# Altium footprint library PCB贴片元件封装库.pcblib: 366 footprints (part 7 of 23)
Each footprint in its own frame and in the unit in brackets; x right, y up, seen from the top. Pads: shape width x height; smd on the part's side, far side on the other; paste and mask are expansions set on the pad; w line width, h text height; cw(c..) or ccw(c..) is an arc to the next point about the centre after c.
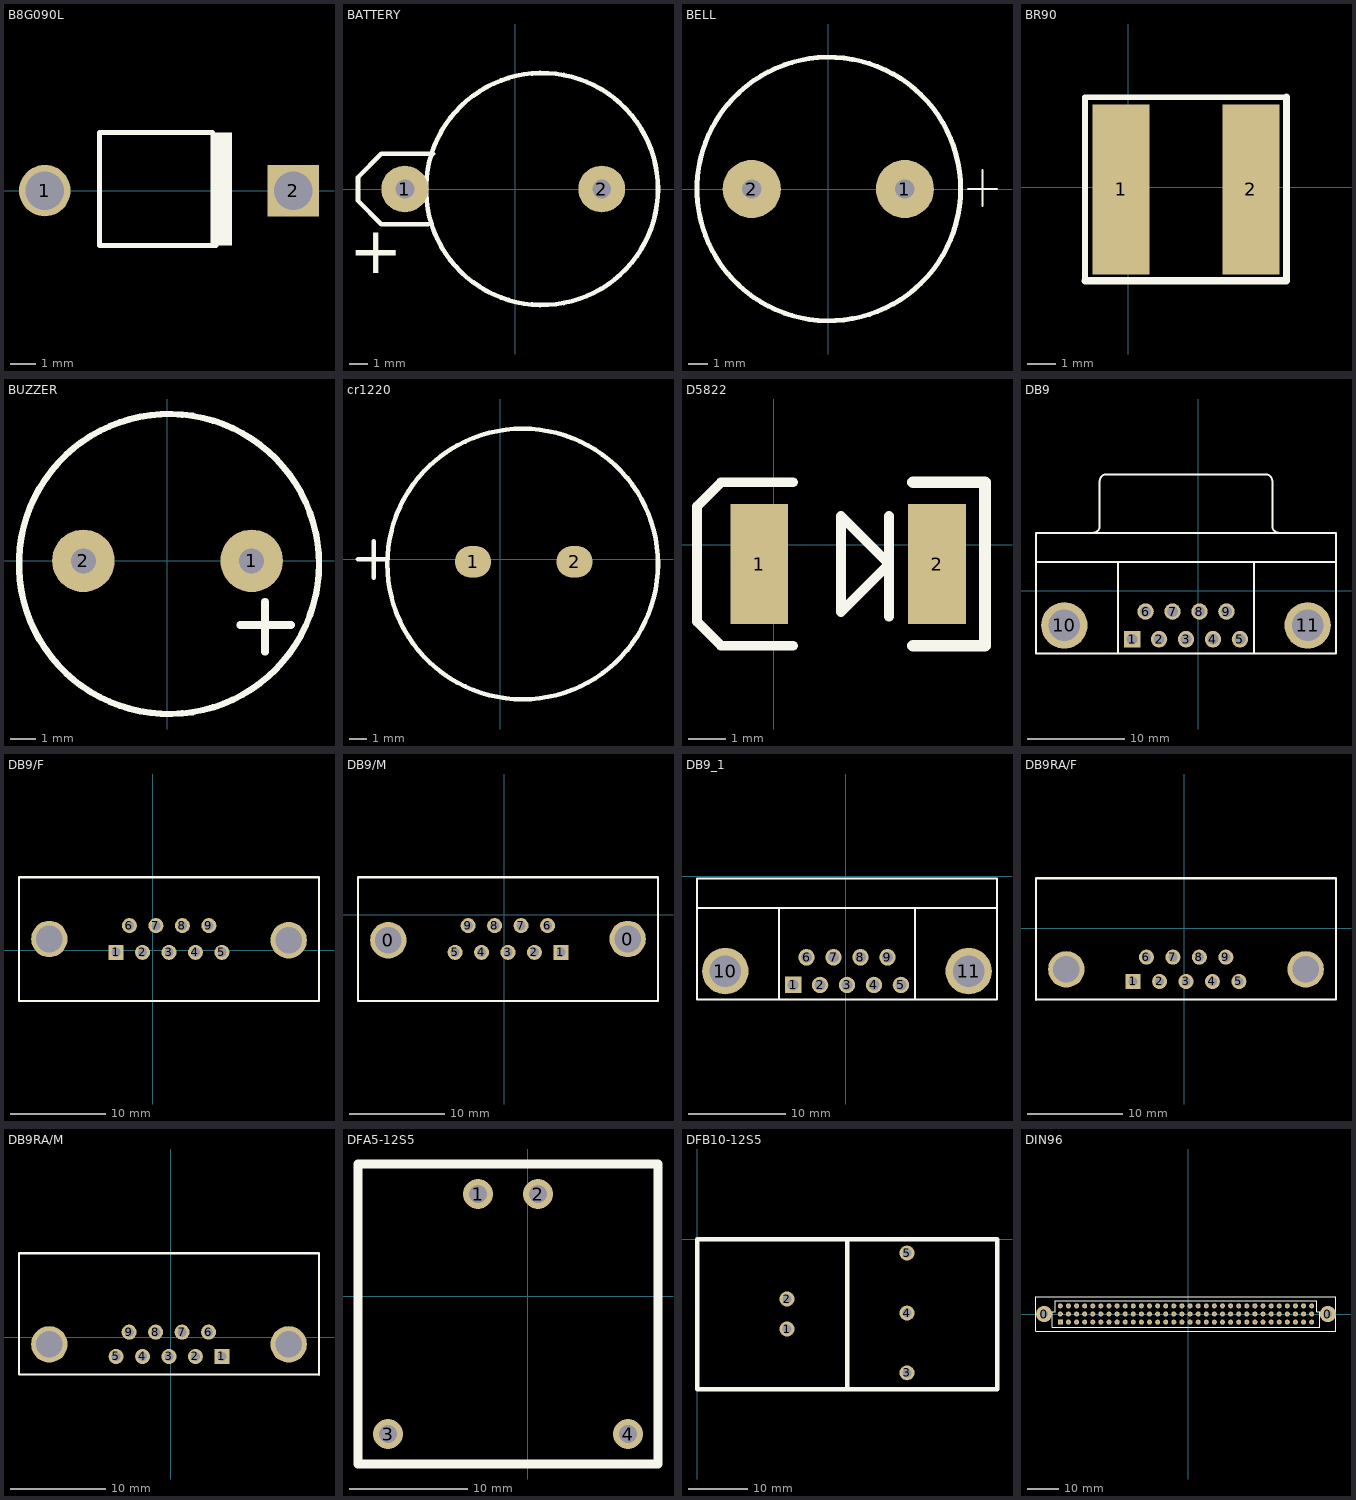
[diagram p6: the footprints below, top view; thin cyan lines are the x and y axes]

## B8G090L [mil]
pads (2):
  round 80 hole 60: 1(80,0)
  rect 80x80 hole 60: 2(465,0)
TopOverlay:
  rectangle: 336.73,-85 370,90
  lines w7.87: 340,90 165,90 165,-85 345,-85

## BATTERY [mil]
pads (2):
  round 100 hole 40: 1(-235,0) 2(185,0)
TopOverlay:
  circle w10: c57.5,0 r247.5
  lines w10: -185,-75 -285,-75 -335,-25 -335,25 -285,75 -175,75
  text "+" at -240,-180 h100

## BELL [mil]
pads (2):
  round 120 hole 40: 1(158,0) 2(-158,0)
TopOverlay:
  circle w10: c1.11,0 r271.89
  lines w4: 288,0 313,0 ; 302,0 348,0 ; 318,-35 318,39

## BR90 [mm]
pads (2):
  rect 2x6 smd: 1(-0.254,-0.081) 2(4.329,-0.081)
TopOverlay:
  lines w0.2: -1.524,-3.302 -1.524,3.175 5.588,3.175
  lines w0.254: -1.524,-3.302 5.588,-3.302 5.588,3.175

## BUZZER [mm]
pads (2):
  round 2.5 hole 1: 1(3.378,0) 2(-3.353,0)
TopOverlay:
  circle w0.254: c0.071,-0.127 r6
  lines w0.305: 2.921,-2.565 4.953,-2.565 ; 3.912,-3.642 3.912,-1.642

## cr1220 [mil]
pads (2):
  oval 80x70 smd: 1(-60,-5) 2(165,-5)
TopOverlay:
  circle w10: c49.92,-10 r300
  lines w10: -315,0 -250,0 ; -280,-40 -280,40

## D5822 [mil]
pads (2):
  rect 60x125 smd: 1(-15,-20) 2(170,-20)
TopOverlay:
  lines w10: 20,-105 -55,-105 -80,-80 -80,40 -55,65 20,65 ; 120,-75 120,30 ; 70,-70 120,-20 70,30 70,-70
  lines w12: 145,-105 220,-105 220,65 145,65

## DB9 [mm]
pads (11):
  rect 1.69x1.69 hole 1.09: 1(-6.81,-4.951)
  round 1.69 hole 1.09: 2(-4.04,-4.951) 3(-1.27,-4.951) 4(1.5,-4.951) 5(4.27,-4.951) 6(-5.425,-2.111) 7(-2.655,-2.111) 8(0.115,-2.111) 9(2.885,-2.111)
  round 4.76 hole 3.26: 10(-13.765,-3.531) 11(11.225,-3.531)
TopOverlay:
  lines w0.2: -16.67,2.969 14.13,2.969 ; -10.83,5.974 ccw(c-10.83,6.669) -10.135,6.669 -10.135,11.269 ; -10.13,11.274 cw(c-9.435,11.274) -9.435,11.969 6.895,11.969 cw(c6.895,11.274) 7.59,11.274 ; -8.27,-6.431 -8.27,2.969 ; 5.73,-6.431 5.73,2.969 ; 7.595,11.269 7.595,6.669 ccw(c8.29,6.669) 8.29,5.974 ; -16.67,-6.431 14.13,-6.431 14.13,5.969 -16.67,5.969 -16.67,-6.431

## DB9/F [mil]
pads (11):
  rect 62x62 hole 38: 1(-150.24,-8.39)
  round 62 hole 38: 2(-41.24,-8.39) 3(67.76,-8.39) 4(176.76,-8.39) 5(285.76,-8.39) 6(-95.24,101.61) 7(13.76,101.61) 8(122.76,101.61) 9(231.76,101.61)
  round 150 hole 110: ""(-425.24,46.61) ""(560.76,41.61)
TopOverlay:
  lines w8: -550.24,-208.39 685.76,-208.39 685.76,301.61
  lines w10: -550.24,-208.39 -550.24,301.61 685.76,301.61

## DB9/M [mil]
pads (11):
  round 150 hole 110: 0(-478.09,-104.06) 0(507.91,-99.06)
  rect 62x62 hole 38: 1(232.91,-154.06)
  round 62 hole 38: 2(123.91,-154.06) 3(14.91,-154.06) 4(-94.09,-154.06) 5(-203.09,-154.06) 6(177.91,-44.06) 7(68.91,-44.06) 8(-40.09,-44.06) 9(-149.09,-44.06)
TopOverlay:
  lines w8: -603.09,155.94 -603.09,-354.06 632.91,-354.06
  lines w10: -603.09,155.94 632.91,155.94 632.91,-354.06

## DB9_1 [mm]
pads (11):
  rect 1.69x1.69 hole 1.09: 1(-5.413,-11.174)
  round 1.69 hole 1.09: 2(-2.643,-11.174) 3(0.127,-11.174) 4(2.897,-11.174) 5(5.667,-11.174) 6(-4.028,-8.334) 7(-1.258,-8.334) 8(1.512,-8.334) 9(4.282,-8.334)
  round 4.76 hole 3.26: 10(-12.368,-9.754) 11(12.622,-9.754)
TopOverlay:
  lines w0.2: -15.273,-3.254 15.527,-3.254 ; -6.873,-12.654 -6.873,-3.254 ; 7.127,-12.654 7.127,-3.254 ; -15.273,-12.654 -15.273,-0.254 15.527,-0.254 15.527,-12.654 -15.273,-12.654

## DB9RA/F [mil]
pads (11):
  rect 62x62 hole 38: 1(-211,-220)
  round 62 hole 38: 2(-102,-220) 3(7,-220) 4(116,-220) 5(225,-220) 6(-156,-120) 7(-47,-120) 8(62,-120) 9(171,-120)
  round 150 hole 110: ""(-486,-170) ""(500,-170)
TopOverlay:
  lines w8: -611,-295 625,-295 625,205
  lines w10: -611,-295 -611,205 625,205

## DB9RA/M [mil]
pads (11):
  rect 62x62 hole 38: 1(209.8,-79.37)
  round 62 hole 38: 2(100.8,-79.37) 3(-8.2,-79.37) 4(-117.2,-79.37) 5(-226.2,-79.37) 6(154.8,20.63) 7(45.8,20.63) 8(-63.2,20.63) 9(-172.2,20.63)
  round 150 hole 110: ""(-501.2,-29.37) ""(484.8,-29.37)
TopOverlay:
  lines w8: -626.2,345.63 -626.2,-154.37 609.8,-154.37
  lines w10: -626.2,345.63 609.8,345.63 609.8,-154.37

## DFA5-12S5 [mil]
pads (4):
  round 100 hole 60: 1(-165,340) 2(35,340) 3(-465,-460) 4(335,-460)
TopOverlay:
  lines w30: -565,-560 -565,440 435,440 435,-560 -565,-560

## DFB10-12S5 [mil]
pads (5):
  round 100 hole 60: 1(600,-600) 2(600,-400) 3(1400,-891.97) 4(1400,-493.94) 5(1400,-93.94)
TopOverlay:
  lines w30: 1000,-1000 1000,0 ; 0,-1000 0,0 2000,0 2000,-1000 0,-1000

## DIN96 [mil]
pads (98):
  round 200 hole 100: 0(-1775,5) 0(1725,5)
  rect 62x62 hole 25: 1A(-1575,-95)
  round 62 hole 25: 1B(-1575,5) 1C(-1575,105) 2A(-1475,-95) 2B(-1475,5) 2C(-1475,105) 3A(-1375,-95) 3B(-1375,5) 3C(-1375,105) 4A(-1275,-95) 4B(-1275,5) 4C(-1275,105) 5A(-1175,-95) 5B(-1175,5) 5C(-1175,105) 6A(-1075,-95) 6B(-1075,5) 6C(-1075,105) 7A(-975,-95) 7B(-975,5) 7C(-975,105) 8A(-875,-95) 8B(-875,5) 8C(-875,105) 9A(-775,-95) 9B(-775,5) 9C(-775,105) 10A(-675,-95) 10B(-675,5) 10C(-675,105) 11A(-575,-95) 11B(-575,5) 11C(-575,105) 12A(-475,-95) 12B(-475,5) 12C(-475,105) 13A(-375,-95) 13B(-375,5) 13C(-375,105) 14A(-275,-95) 14B(-275,5) 14C(-275,105) 15A(-175,-95) 15B(-175,5) 15C(-175,105) 16A(-75,-95) 16B(-75,5) 16C(-75,105) 17A(25,-95) 17B(25,5) 17C(25,105) 18A(125,-95) 18B(125,5) 18C(125,105) 19A(225,-95) 19B(225,5) 19C(225,105) 20A(325,-95) 20B(325,5) 20C(325,105) 21A(425,-95) 21B(425,5) 21C(425,105) 22A(525,-95) 22B(525,5) 22C(525,105) 23A(625,-95) 23B(625,5) 23C(625,105) 24A(725,-95) 24B(725,5) 24C(725,105) 25A(825,-95) 25B(825,5) 25C(825,105) 26A(925,-95) 26B(925,5) 26C(925,105) 27A(1025,-95) 27B(1025,5) 27C(1025,105) 28A(1125,-95) 28B(1125,5) 28C(1125,105) 29A(1225,-95) 29B(1225,5) 29C(1225,105) 30A(1325,-95) 30B(1325,5) 30C(1325,105) 31A(1425,-95) 31B(1425,5) 31C(1425,105) 32A(1525,-95) 32B(1525,5) 32C(1525,105)
TopOverlay:
  lines w10: -1875,-205 -1875,215 1825,215 1825,-205 -1875,-205 ; -1675,-160 -1675,35 -1640,35 -1640,170 1590,170 1590,35 1625,35 1625,-160 -1675,-160